# Altium footprint library MB1404.PcbLib: 69 footprints (part 5 of 5)
Each footprint in its own frame and in the unit in brackets; x right, y up, seen from the top. Pads: shape width x height; smd on the part's side, far side on the other; paste and mask are expansions set on the pad; w line width, h text height; cw(c..) or ccw(c..) is an arc to the next point about the centre after c.
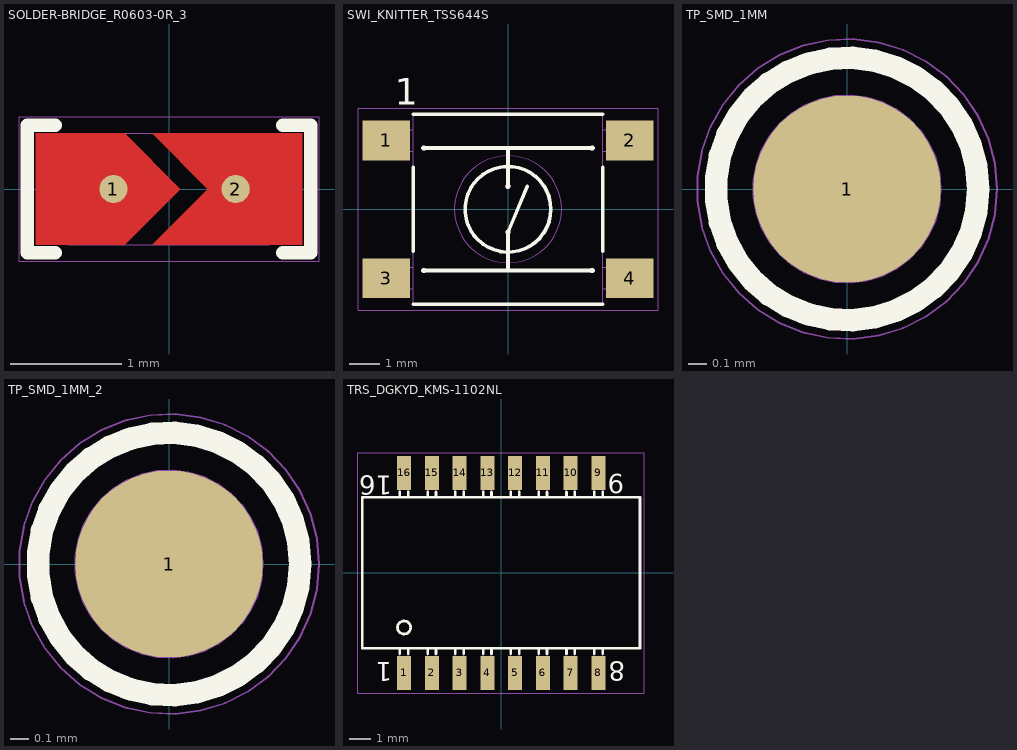
[diagram p4: the footprints below, top view; thin cyan lines are the x and y axes]

## SOLDER-BRIDGE_R0603-0R_3 [mil]
pads (2):
  round 10 smd paste-393.7 mask+4: 1(-19.68,0) 2(23.62,0)
Top Layer:
  region: -47.24,-19.68 -47.24,19.68 -15.75,19.68 3.94,0 -15.75,-19.68
  region: -5.91,19.68 13.78,0 -5.91,-19.68 47.24,-19.68 47.24,19.68
Top Overlay:
  lines w4.72: -40.35,-22.64 -50.2,-22.64 -50.2,6.89 -50.2,22.64 -40.35,22.64 ; 40.35,-22.64 50.2,-22.64 50.2,22.64 40.35,22.64
Top Paste:
  rectangle: 14.95,-19.68 40.15,19.68
  rectangle: -40.15,-19.68 -14.95,19.68
Top Solder:
  region: -42.32,21.65 -14.76,21.65 6.89,0 -14.76,-21.65 -42.32,-21.65
  region: 10.83,0 -10.83,21.65 42.32,21.65 42.32,-21.65 -10.83,-21.65
Mechanical 14:
  lines w0.39: -35.43,-19.68 -35.43,19.68 35.43,19.68 35.43,-19.68 -35.43,-19.68
  text "'.Designator'" at 177.52,28.7 h29.53
Mechanical 16:
  lines w0.39: -53.15,-25.59 -53.15,25.59 -7.87,25.59 53.15,25.59 53.15,-25.59 -53.15,-25.59
3D body "R0603.STEP": height 22.05, standoff 0, extent -33.46,-15.74 33.47,15.75
3D body: height 19.68, standoff 0, extent -35.63,-19.88 35.63,19.88

## SWI_KNITTER_TSS644S [mm] "MCD-02417"
height 7.3
pads (4):
  rect 1.55x1.3 smd mask+0.05: 1(-3.975,2.25) 2(3.975,2.25) 3(-3.975,-2.25) 4(3.975,-2.25)
Top Overlay:
  circle w0.12: c0,0.75 r0.025
  circle w0.12: c0,-0.75 r0.025
  circle w0.12: c-2.75,2 r0.025
  circle w0.12: c2.75,2 r0.025
  circle w0.12: c-2.75,-2 r0.025
  circle w0.12: c2.75,-2 r0.025
  circle w0.12: c0,0 r1.4
  lines w0.12: -3.1,-3.1 3.1,-3.1 ; -3.1,-1.375 -3.1,1.375 ; -3.1,3.1 3.1,3.1 ; -2.75,-2 2.75,-2 ; -2.75,2 2.75,2 ; 0,-2 0,-0.75 0.625,0.75 ; 0,0.75 0,2 ; 3.1,-1.375 3.1,1.375
  text "1" at -3.7,3.125 h1.5
Mechanical 14:
  circle w0.01: c0,0 r1.75
  circle w0.1: c2.75,-2 r0.025
  circle w0.1: c-2.75,-2 r0.025
  circle w0.1: c2.75,2 r0.025
  circle w0.1: c-2.75,2 r0.025
  circle w0.1: c0,-0.75 r0.025
  circle w0.1: c0,0.75 r0.025
  lines w0.01: -3.1,-2.6 -4.5,-2.6 -4.5,-1.9 -3.1,-1.9 ; -3.1,1.9 -4.5,1.9 -4.5,2.6 -3.1,2.6 ; -2.75,-2 2.75,-2 ; -2.75,2 2.75,2 ; 0,-2 0,-0.75 0.625,0.75 ; 0,0.75 0,2 ; 3.1,-2.6 4.5,-2.6 4.5,-1.9 3.1,-1.9 ; 3.1,1.9 4.5,1.9 4.5,2.6 3.1,2.6 ; -3.1,-3.1 3.1,-3.1 3.1,3.1 -3.1,3.1 -3.1,-3.1
  text "4" at 4.615,-2.725 h1.5
  text "2" at 4.635,1.835 h1.5
  text "3" at -5.22,-2.73 h1.5
  text "1" at -5.005,1.795 h1.5
  text "'.Designator'" at -2,-0.5 h0.75
Mechanical 16:
  lines w0.01: -4.9,-3.3 4.9,-3.3 4.9,3.3 -4.9,3.3 -4.9,-3.3
3D body: height 7.3, standoff 5.6, extent -1.19,-1.197 1.2,1.198
3D body: height 4.3, standoff 3.5, extent -1.75,-1.75 1.75,1.75
3D body: height 0.2, standoff 0, extent -4.5,1.9 -3.1,2.6
3D body: height 0.2, standoff 0, extent -4.5,-2.6 -3.1,-1.9
3D body: height 0.2, standoff 0, extent 3.1,1.9 4.5,2.6
3D body: height 0.2, standoff 0, extent 3.1,-2.6 4.5,-1.9
3D body: height 3.5, standoff 0, extent -3.1,-3.1 3.1,3.1
3D body: height 5.6, standoff 4.3, extent -0.794,-0.798 0.8,0.799

## TP_SMD_1MM [mm]
height 2.96
pads (1):
  round 1 smd paste-10 mask+0.05: 1(0,0)
Top Overlay:
  circle w0.12: c0,0 r0.7
Mechanical 14:
  circle w0.01: c0,0 r0.5
  text "'.Designator'" at 2.05,0.575 h0.75
Mechanical 16:
  circle w0.01: c0,0 r0.8

## TP_SMD_1MM_2 [mm]
pads (1):
  round 1 smd paste-10 mask+0.05: 1(0,0)
Top Overlay:
  circle w0.12: c0,0 r0.7
Mechanical 14:
  circle w0.01: c0,0 r0.5
  text "'.Designator'" at 0.829,-4.591 h0.75
Mechanical 16:
  circle w0.01: c0,0 r0.8

## TRS_DGKYD_KMS-1102NL [mm]
height 6.2
pads (16):
  rect 0.64x1.55 smd mask+0.05: 1(-4.445,-4.575) 2(-3.175,-4.575) 3(-1.905,-4.575) 4(-0.635,-4.575) 5(0.635,-4.575) 6(1.905,-4.575) 7(3.175,-4.575) 8(4.445,-4.575) 9(4.445,4.575) 10(3.175,4.575) 11(1.905,4.575) 12(0.635,4.575) 13(-0.635,4.575) 14(-1.905,4.575) 15(-3.175,4.575) 16(-4.445,4.575)
Top Overlay:
  circle w0.12: c-4.445,-2.5 r0.3
  lines w0.12: -4.635,-3.7 -4.635,-3.45 ; -4.635,3.45 -4.635,3.7 ; -4.255,-3.7 -4.255,-3.45 ; -4.255,3.45 -4.255,3.7 ; -3.365,-3.7 -3.365,-3.45 ; -3.365,3.45 -3.365,3.7 ; -2.984,-3.7 -2.984,-3.45 ; -2.984,3.45 -2.984,3.7 ; -2.095,-3.7 -2.095,-3.45 ; -2.095,3.45 -2.095,3.7 ; -1.714,-3.7 -1.714,-3.45 ; -1.714,3.45 -1.714,3.7 ; -0.826,-3.7 -0.826,-3.45 ; -0.826,3.45 -0.826,3.7 ; -0.445,-3.7 -0.445,-3.45 ; -0.445,3.45 -0.445,3.7 ; 0.445,-3.7 0.445,-3.45 ; 0.445,3.45 0.445,3.7 ; 0.826,-3.7 0.826,-3.45 ; 0.826,3.45 0.826,3.7 ; 1.714,-3.7 1.714,-3.45 ; 1.714,3.45 1.714,3.7 ; 2.095,-3.7 2.095,-3.45 ; 2.095,3.45 2.095,3.7 ; 2.984,-3.7 2.984,-3.45 ; 2.984,3.45 2.984,3.7 ; 3.365,-3.7 3.365,-3.45 ; 3.365,3.45 3.365,3.7 ; 4.255,-3.7 4.255,-3.45 ; 4.255,3.45 4.255,3.7 ; 4.635,-3.7 4.635,-3.45 ; 4.635,3.45 4.635,3.7 ; -6.35,-3.45 6.35,-3.45 6.35,3.45 -6.35,3.45 -6.35,-3.45
  text "16" at -4.979,4.734 h1.5
  text "9" at 5.621,4.809 h1.5
  text "8" at 5.671,-3.766 h1.5
  text "1" at -4.979,-3.791 h1.5
Mechanical 14:
  lines w0.01: -4.635,-4 -4.255,-4 ; -4.635,-3.45 -4.635,-4.7 -4.255,-4.7 -4.255,-3.45 ; -4.635,3.45 -4.635,4.7 -4.255,4.7 -4.255,3.45 ; -4.635,4 -4.255,4 ; -3.365,-4 -2.984,-4 ; -3.365,-3.45 -3.365,-4.7 -2.984,-4.7 -2.984,-3.45 ; -3.365,3.45 -3.365,4.7 -2.984,4.7 -2.984,3.45 ; -3.365,4 -2.984,4 ; -2.095,-4 -1.714,-4 ; -2.095,-3.45 -2.095,-4.7 -1.714,-4.7 -1.714,-3.45 ; -2.095,3.45 -2.095,4.7 -1.714,4.7 -1.714,3.45 ; -2.095,4 -1.714,4 ; -0.826,-4 -0.445,-4 ; -0.826,-3.45 -0.826,-4.7 -0.445,-4.7 -0.445,-3.45 ; -0.826,3.45 -0.826,4.7 -0.445,4.7 -0.445,3.45 ; -0.826,4 -0.445,4 ; 0.445,-4 0.826,-4 ; 0.445,-3.45 0.445,-4.7 0.826,-4.7 0.826,-3.45 ; 0.445,3.45 0.445,4.7 0.826,4.7 0.826,3.45 ; 0.445,4 0.826,4 ; 1.714,-4 2.095,-4 ; 1.714,-3.45 1.714,-4.7 2.095,-4.7 2.095,-3.45 ; 1.714,3.45 1.714,4.7 2.095,4.7 2.095,3.45 ; 1.714,4 2.095,4 ; 2.984,-4 3.365,-4 ; 2.984,-3.45 2.984,-4.7 3.365,-4.7 3.365,-3.45 ; 2.984,3.45 2.984,4.7 3.365,4.7 3.365,3.45 ; 2.984,4 3.365,4 ; 4.255,-4 4.635,-4 ; 4.255,-3.45 4.255,-4.7 4.635,-4.7 4.635,-3.45 ; 4.255,3.45 4.255,4.7 4.635,4.7 4.635,3.45 ; 4.255,4 4.635,4 ; -6.35,-3.45 -6.35,3.45 6.35,3.45 6.35,-3.45 -6.35,-3.45
  text "1" at -4.635,-3.35 h1.5
  text "8" at 4.127,-3.35 h1.5
  text "9" at 4.127,2.4 h1.5
  text "16" at -5.08,2.4 h1.5
  text "'.Designator'" at 4.471,0.734 h0.75
Mechanical 16:
  lines w0.01: -6.55,-5.5 6.5,-5.5 6.55,-5.5 6.55,5.5 -6.55,5.5 -6.55,3.45 -6.55,-5.5
3D body: height 1.2, standoff 1, extent 4.255,-4.25 4.635,-3.45
3D body: height 1, standoff 0, extent 4.255,-4.25 4.635,-4
3D body: height 0.2, standoff 0, extent 4.255,-4.7 4.635,-4
3D body: height 1.2, standoff 1, extent 2.984,-4.25 3.365,-3.45
3D body: height 1, standoff 0, extent 2.984,-4.25 3.365,-4
3D body: height 0.2, standoff 0, extent 2.984,-4.7 3.365,-4
3D body: height 1.2, standoff 1, extent 1.714,-4.25 2.095,-3.45
3D body: height 1, standoff 0, extent 1.714,-4.25 2.095,-4
3D body: height 0.2, standoff 0, extent 1.714,-4.7 2.095,-4
3D body: height 1.2, standoff 1, extent 0.445,-4.25 0.826,-3.45
3D body: height 1, standoff 0, extent 0.445,-4.25 0.826,-4
3D body: height 0.2, standoff 0, extent 0.445,-4.7 0.826,-4
3D body: height 1.2, standoff 1, extent -0.826,-4.25 -0.445,-3.45
3D body: height 1, standoff 0, extent -0.826,-4.25 -0.445,-4
3D body: height 0.2, standoff 0, extent -0.826,-4.7 -0.445,-4
3D body: height 1.2, standoff 1, extent -2.095,-4.25 -1.714,-3.45
3D body: height 1, standoff 0, extent -2.095,-4.25 -1.714,-4
3D body: height 0.2, standoff 0, extent -2.095,-4.7 -1.714,-4
3D body: height 1.2, standoff 1, extent -3.365,-4.25 -2.984,-3.45
3D body: height 1, standoff 0, extent -3.365,-4.25 -2.984,-4
3D body: height 0.2, standoff 0, extent -3.365,-4.7 -2.984,-4
3D body: height 1.2, standoff 1, extent -4.635,-4.25 -4.255,-3.45
3D body: height 1, standoff 0, extent -4.635,-4.25 -4.255,-4
3D body: height 0.2, standoff 0, extent -4.635,-4.7 -4.255,-4
3D body: height 1.2, standoff 1, extent 4.255,3.45 4.635,4.25
3D body: height 1, standoff 0, extent 4.255,4 4.635,4.25
3D body: height 0.2, standoff 0, extent 4.255,4 4.635,4.7
3D body: height 1.2, standoff 1, extent 2.984,3.45 3.365,4.25
3D body: height 1, standoff 0, extent 2.984,4 3.365,4.25
3D body: height 0.2, standoff 0, extent 2.984,4 3.365,4.7
3D body: height 1.2, standoff 1, extent 1.714,3.45 2.095,4.25
3D body: height 1, standoff 0, extent 1.714,4 2.095,4.25
3D body: height 0.2, standoff 0, extent 1.714,4 2.095,4.7
3D body: height 1.2, standoff 1, extent 0.445,3.45 0.826,4.25
3D body: height 1, standoff 0, extent 0.445,4 0.826,4.25
3D body: height 0.2, standoff 0, extent 0.445,4 0.826,4.7
3D body: height 1.2, standoff 1, extent -0.826,3.45 -0.445,4.25
3D body: height 1, standoff 0, extent -0.826,4 -0.445,4.25
3D body: height 0.2, standoff 0, extent -0.826,4 -0.445,4.7
3D body: height 1.2, standoff 1, extent -2.095,3.45 -1.714,4.25
3D body: height 1, standoff 0, extent -2.095,4 -1.714,4.25
3D body: height 0.2, standoff 0, extent -2.095,4 -1.714,4.7
3D body: height 1.2, standoff 1, extent -3.365,3.45 -2.984,4.25
3D body: height 1, standoff 0, extent -3.365,4 -2.984,4.25
3D body: height 0.2, standoff 0, extent -3.365,4 -2.984,4.7
3D body: height 6.3, standoff 6.2, extent -4.742,-2.799 -4.145,-2.2
3D body: height 0.2, standoff 0, extent -4.635,4 -4.255,4.7
3D body: height 1, standoff 0, extent -4.635,4 -4.255,4.25
3D body: height 1.2, standoff 1, extent -4.635,3.45 -4.255,4.25
3D body: height 6.2, standoff 0, extent -6.35,-3.45 6.35,3.45